# Altium schematic symbol library FPGA_Xilinx_Virtex6.SchLib: 28 symbols (part 10 of 21) (continued)
## XC6VLX195T-FF784 (continued)
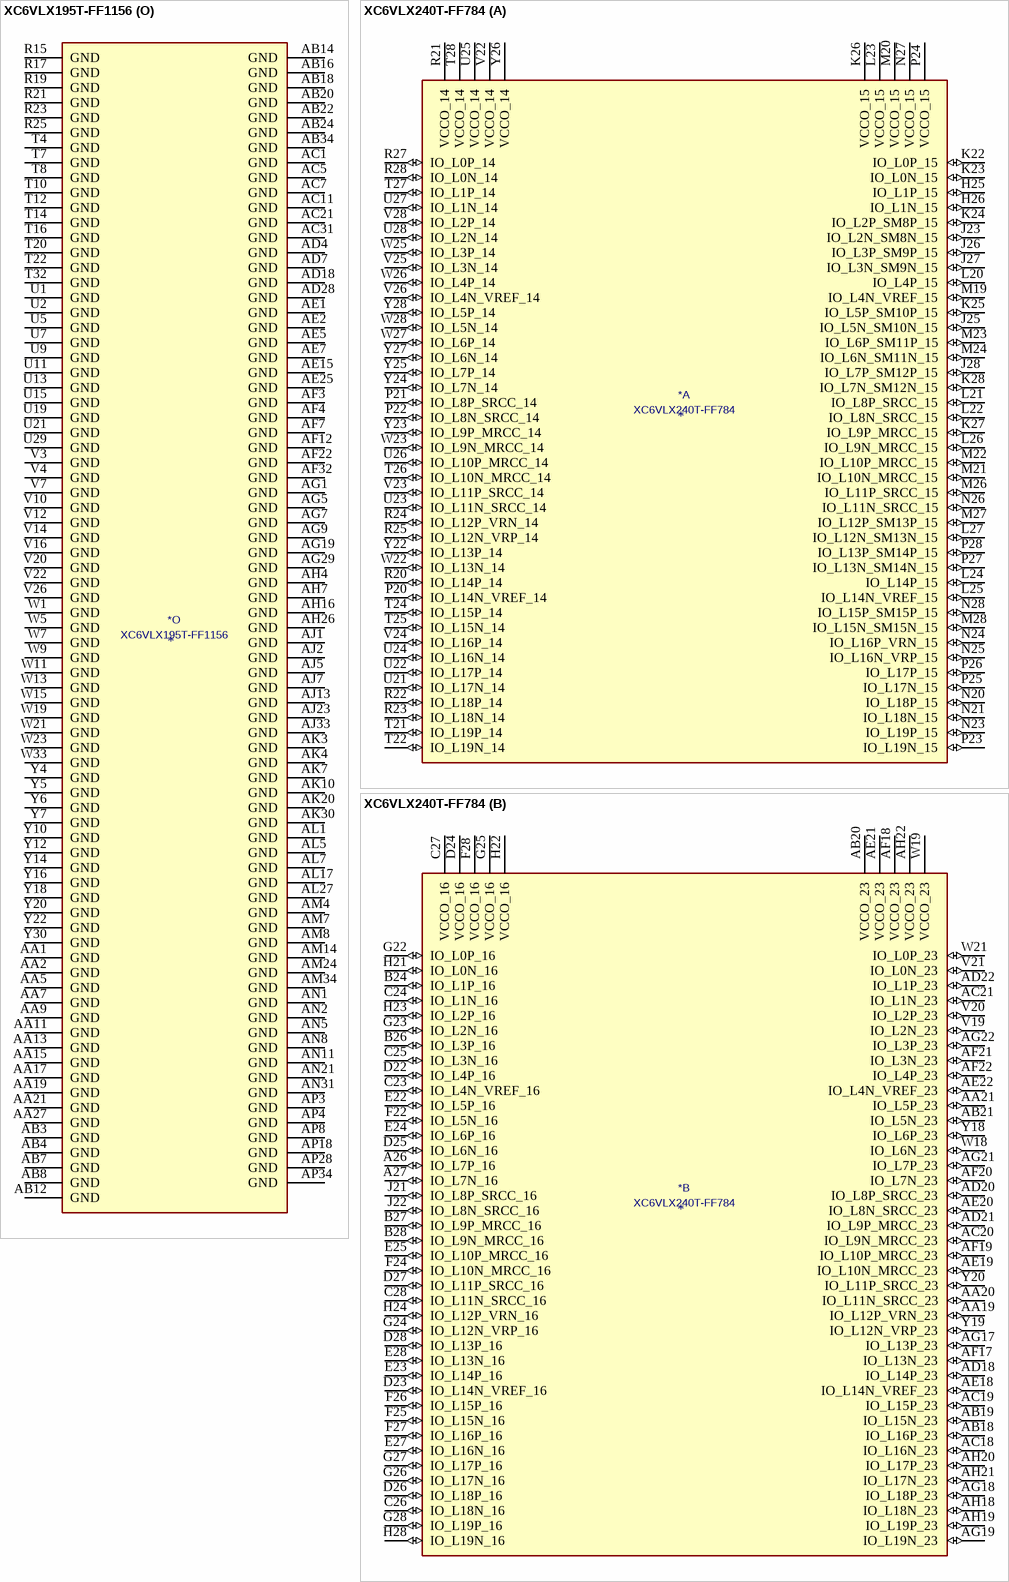
[diagram p52: symbols XC6VLX195T-FF1156 to XC6VLX240T-FF784]

## XC6VLX195T-FF1156
designator *  value XC6VLX195T-FF1156
ki_keywords: FPGA; ki_description: Virtex 6 LXT 195 XC6VLX195T-FF1156
part A pins: AA25 IO_L6P_13 (io), AA26 IO_L17P_13 (io), AA28 IO_L7P_13 (io), AA29 IO_L7N_13 (io), AA30 IO_L1P_13 (io), AA31 IO_L1N_13 (io), AA32 VCCO_13 (power), AA33 IO_L0N_13 (io), AA34 IO_L0P_13 (io), AB25 IO_L19P_13 (io), AB26 IO_L17N_13 (io), AB27 IO_L15P_13 (io), AB28 IO_L13P_13 (io), AB29 VCCO_13 (power), AB30 IO_L3P_13 (io), AB31 IO_L3N_13 (io), AB32 IO_L12P_VRN_13 (io), AB33 IO_L4N_VREF_13 (io), AC25 IO_L19N_13 (io), AC26 VCCO_13 (power), AC27 IO_L15N_13 (io), AC28 IO_L13N_13 (io), AC29 IO_L11N_SRCC_13 (io), AC30 IO_L9N_MRCC_13 (io), AC32 IO_L12N_VRP_13 (io), AC33 IO_L4P_13 (io), AC34 IO_L2N_13 (io), AD25 IO_L0P_12 (io), AD26 IO_L0N_12 (io), AD27 IO_L1N_12 (io), AD29 IO_L11P_SRCC_13 (io), AD30 IO_L9P_MRCC_13 (io), AD31 IO_L5N_13 (io), AD32 IO_L14P_13 (io), AD33 VCCO_13 (power), AD34 IO_L2P_13 (io), AE26 IO_L11N_SRCC_12 (io), AE27 IO_L1P_12 (io), AE28 IO_L3P_12 (io), AE29 IO_L3N_12 (io), AE30 VCCO_13 (power), AE31 IO_L5P_13 (io), AE32 IO_L14N_VREF_13 (io), AE33 IO_L10P_MRCC_13 (io), AE34 IO_L8P_SRCC_13 (io), AF26 IO_L11P_SRCC_12 (io), AF27 VCCO_12 (power), AF28 IO_L5P_12 (io), AF29 IO_L5N_12 (io), AF30 IO_L10P_MRCC_12 (io), AF31 IO_L18N_13 (io), AF33 IO_L10N_MRCC_13 (io), AF34 IO_L8N_SRCC_13 (io), AG27 IO_L9P_MRCC_12 (io), AG28 IO_L9N_MRCC_12 (io), AG30 IO_L10N_MRCC_12 (io), AG31 IO_L18P_13 (io), AG32 IO_L16N_13 (io), AG33 IO_L16P_13 (io), AG34 VCCO_12 (power), AH29 IO_L7P_12 (io), AH30 IO_L7N_12 (io), AH31 VCCO_12 (power), AH32 IO_L2N_12 (io), AH33 IO_L2P_12 (io), AH34 IO_L4N_VREF_12 (io), AJ29 IO_L13P_12 (io), AJ30 IO_L13N_12 (io), AJ31 IO_L12P_VRN_12 (io), AJ32 IO_L12N_VRP_12 (io), AJ34 IO_L4P_12 (io), AK31 IO_L15N_12 (io), AK32 IO_L14N_VREF_12 (io), AK33 IO_L14P_12 (io), AK34 IO_L6N_12 (io), AL30 IO_L19P_12 (io), AL31 IO_L15P_12 (io), AL32 VCCO_12 (power), AL33 IO_L16N_12 (io), AL34 IO_L6P_12 (io), AM31 IO_L19N_12 (io), AM32 IO_L17N_12 (io), AM33 IO_L16P_12 (io), AN32 IO_L17P_12 (io), AN33 IO_L8P_SRCC_12 (io), AN34 IO_L8N_SRCC_12 (io), AP32 IO_L18P_12 (io), AP33 IO_L18N_12 (io), Y26 IO_L6N_13 (io)
part B pins: K31 IO_L2N_SM8N_15 (io), K32 IO_L2P_SM8P_15 (io), K34 IO_L16P_VRN_15 (io), L28 IO_L7P_SM12P_15 (io), L29 IO_L11P_SRCC_15 (io), L30 IO_L11N_SRCC_15 (io), L31 IO_L0N_15 (io), L32 VCCO_15 (power), L33 IO_L6P_SM11P_15 (io), L34 IO_L16N_VRP_15 (io), M25 IO_L1N_15 (io), M26 IO_L3P_SM9P_15 (io), M27 IO_L3N_SM9N_15 (io), M28 IO_L7N_SM12N_15 (io), M29 VCCO_15 (power), M30 IO_L17P_15 (io), M31 IO_L0P_15 (io), M32 IO_L6N_SM11N_15 (io), M33 IO_L10N_MRCC_15 (io), N25 IO_L1P_15 (io), N26 VCCO_15 (power), N27 IO_L5P_SM10P_15 (io), N28 IO_L9P_MRCC_15 (io), N29 IO_L9N_MRCC_15 (io), N30 IO_L17N_15 (io), N32 IO_L8P_SRCC_15 (io), N33 IO_L10P_MRCC_15 (io), N34 IO_L18P_15 (io), P25 IO_L12P_SM13P_15 (io), P26 IO_L12N_SM13N_15 (io), P27 IO_L5N_SM10N_15 (io), P29 IO_L19P_15 (io), P30 IO_L4N_VREF_15 (io), P31 IO_L4P_15 (io), P32 IO_L8N_SRCC_15 (io), P33 VCCO_15 (power), P34 IO_L18N_15 (io), R26 IO_L15P_SM15P_15 (io), R27 IO_L13N_SM14N_15 (io), R28 IO_L13P_SM14P_15 (io), R29 IO_L19N_15 (io), R30 VCCO_15 (power), R31 IO_L14P_15 (io), R32 IO_L14N_VREF_15 (io), R33 IO_L2P_14 (io), R34 IO_L2N_14 (io), T25 IO_L0N_14 (io), T26 IO_L15N_SM15N_15 (io), T27 VCCO_14 (power), T28 IO_L1P_14 (io), T29 IO_L1N_14 (io), T30 IO_L3P_14 (io), T31 IO_L3N_14 (io), T33 IO_L4P_14 (io), T34 IO_L4N_VREF_14 (io), U25 IO_L0P_14 (io), U26 IO_L5P_14 (io), U27 IO_L5N_14 (io), U28 IO_L7P_14 (io), U30 IO_L8N_SRCC_14 (io), U31 IO_L8P_SRCC_14 (io), U32 IO_L6N_14 (io), U33 IO_L6P_14 (io), U34 VCCO_14 (power), V25 IO_L18N_14 (io), V27 IO_L11N_SRCC_14 (io), V28 IO_L11P_SRCC_14 (io), V29 IO_L7N_14 (io), V30 IO_L9P_MRCC_14 (io), V31 VCCO_14 (power), V32 IO_L12P_VRN_14 (io), V33 IO_L12N_VRP_14 (io), V34 IO_L10P_MRCC_14 (io), W25 IO_L18P_14 (io), W26 IO_L19N_14 (io), W27 IO_L19P_14 (io), W28 VCCO_14 (power), W29 IO_L15P_14 (io), W30 IO_L9N_MRCC_14 (io), W31 IO_L16P_14 (io), W32 IO_L16N_14 (io), W34 IO_L10N_MRCC_14 (io), Y27 IO_L17N_14 (io), Y28 IO_L17P_14 (io), Y29 IO_L15N_14 (io), Y31 IO_L13N_14 (io), Y32 IO_L13P_14 (io), Y33 IO_L14P_14 (io), Y34 IO_L14N_VREF_14 (io)
part C pins: A32 VCCO_16 (power), A33 IO_L4P_16 (io), AC19 IO_L14P_22 (io), AC20 IO_L6P_22 (io), AD19 IO_L14N_VREF_22 (io), AD20 IO_L6N_22 (io), AD21 IO_L0N_22 (io), AE19 IO_L8N_SRCC_22 (io), AE20 VCCO_22 (power), AE21 IO_L0P_22 (io), AF19 IO_L8P_SRCC_22 (io), AF20 IO_L11P_SRCC_22 (io), AF21 IO_L11N_SRCC_22 (io), AG20 IO_L18P_22 (io), AG21 IO_L18N_22 (io), AG22 IO_L2P_22 (io), AH20 IO_L12N_VRP_22 (io), AH21 VCCO_22 (power), AH22 IO_L2N_22 (io), AJ20 IO_L12P_VRN_22 (io), AJ21 IO_L16N_22 (io), AJ22 IO_L4N_VREF_22 (io), AK19 IO_L10P_MRCC_22 (io), AK21 IO_L16P_22 (io), AK22 IO_L4P_22 (io), AL18 IO_L1N_22 (io), AL19 IO_L10N_MRCC_22 (io), AL20 IO_L7N_22 (io), AL21 IO_L13N_22 (io), AL22 VCCO_22 (power), AL23 IO_L15N_22 (io), AM18 IO_L1P_22 (io), AM19 VCCO_22 (power), AM20 IO_L7P_22 (io), AM21 IO_L13P_22 (io), AM22 IO_L17P_22 (io), AM23 IO_L15P_22 (io), AN18 IO_L3N_22 (io), AN19 IO_L5P_22 (io), AN20 IO_L5N_22 (io), AN22 IO_L17N_22 (io), AN23 IO_L19N_22 (io), AP19 IO_L3P_22 (io), AP20 IO_L9P_MRCC_22 (io), AP21 IO_L9N_MRCC_22 (io), AP22 IO_L19P_22 (io), AP23 VCCO_22 (power), B32 IO_L0N_16 (io), B33 IO_L4N_VREF_16 (io), B34 IO_L6N_16 (io), C32 IO_L0P_16 (io), C33 IO_L6P_16 (io), C34 IO_L8N_SRCC_16 (io), D31 IO_L15P_16 (io), D32 IO_L15N_16 (io), D33 VCCO_16 (power), D34 IO_L8P_SRCC_16 (io), E31 IO_L11N_SRCC_16 (io), E32 IO_L2P_16 (io), E33 IO_L2N_16 (io), E34 IO_L12P_VRN_16 (io), F30 IO_L3P_16 (io), F31 IO_L11P_SRCC_16 (io), F33 IO_L10P_MRCC_16 (io), F34 IO_L12N_VRP_16 (io), G30 IO_L3N_16 (io), G31 IO_L5P_16 (io), G32 IO_L17P_16 (io), G33 IO_L10N_MRCC_16 (io), G34 VCCO_16 (power), H30 IO_L5N_16 (io), H31 VCCO_16 (power), H32 IO_L17N_16 (io), H33 IO_L14N_VREF_16 (io), H34 IO_L14P_16 (io), J26 IO_L1P_16 (io), J27 IO_L1N_16 (io), J28 VCCO_16 (power), J29 IO_L7N_16 (io), J30 IO_L13P_16 (io), J31 IO_L19P_16 (io), J32 IO_L19N_16 (io), J34 IO_L16N_16 (io), K25 VCCO_16 (power), K26 IO_L9P_MRCC_16 (io), K27 IO_L9N_MRCC_16 (io), K28 IO_L7P_16 (io), K29 IO_L13N_16 (io), K33 IO_L16P_16 (io), L25 IO_L18P_16 (io), L26 IO_L18N_16 (io)
part D pins: AA23 IO_L16P_RS0_24 (io), AA24 IO_L14N_VREF_FOE_B_MOSI_24 (io), AB23 IO_L16N_CSO_B_24 (io), AC22 IO_L19P_24 (io), AC23 IO_L18P_24 (io), AC24 IO_L18N_24 (io), AD22 IO_L19N_24 (io), AD23 VCCO_24 (power), AD24 IO_L11P_SRCC_24 (io), AE22 IO_L17N_VRP_24 (io), AE23 IO_L17P_VRN_24 (io), AE24 IO_L11N_SRCC_24 (io), AF23 IO_L15P_FWE_B_24 (io), AF24 IO_L13N_D0_FS0_24 (io), AF25 IO_L13P_D1_FS1_24 (io), AG23 IO_L15N_RS1_24 (io), AG24 VCCO_24 (power), AG25 IO_L2P_23 (io), AG26 IO_L2N_23 (io), AH23 IO_L11P_SRCC_23 (io), AH24 IO_L11N_SRCC_23 (io), AH25 IO_L8P_SRCC_23 (io), AH27 IO_L0P_23 (io), AH28 IO_L0N_23 (io), AJ24 IO_L14P_23 (io), AJ25 IO_L8N_SRCC_23 (io), AJ26 IO_L12N_VRP_23 (io), AJ27 IO_L10N_MRCC_23 (io), AJ28 VCCO_23 (power), AK23 IO_L18P_23 (io), AK24 IO_L14N_VREF_23 (io), AK25 VCCO_23 (power), AK26 IO_L12P_VRN_23 (io), AK27 IO_L10P_MRCC_23 (io), AK28 IO_L6N_23 (io), AK29 IO_L4N_VREF_23 (io), AL24 IO_L18N_23 (io), AL25 IO_L16N_23 (io), AL26 IO_L13P_23 (io), AL28 IO_L6P_23 (io), AL29 IO_L4P_23 (io), AM25 IO_L16P_23 (io), AM26 IO_L13N_23 (io), AM27 IO_L9N_MRCC_23 (io), AM28 IO_L7N_23 (io), AM29 VCCO_23 (power), AM30 IO_L1N_23 (io), AN24 IO_L17N_23 (io), AN25 IO_L17P_23 (io), AN26 VCCO_23 (power), AN27 IO_L9P_MRCC_23 (io), AN28 IO_L7P_23 (io), AN29 IO_L5P_23 (io), AN30 IO_L1P_23 (io), AP24 IO_L19N_23 (io), AP25 IO_L19P_23 (io), AP26 IO_L15N_23 (io), AP27 IO_L15P_23 (io), AP29 IO_L5N_23 (io), AP30 IO_L3P_23 (io), AP31 IO_L3N_23 (io), F23 IO_L3N_D12_24 (io), F24 IO_L3P_D13_24 (io), G23 IO_L5N_D8_24 (io), G24 VCCO_24 (power), H23 IO_L5P_D9_24 (io), H24 IO_L7N_D4_24 (io), H25 IO_L7P_D5_24 (io), J24 IO_L9N_MRCC_24 (io), J25 IO_L9P_MRCC_24 (io), K23 IO_L1N_GC_24 (io), K24 IO_L1P_GC_24 (io), L22 VCCO_24 (power), L23 IO_L0P_GC_24 (io), L24 IO_L2N_D14_24 (io), M22 IO_L0N_GC_24 (io), M23 IO_L2P_D15_24 (io), N23 IO_L4P_D11_24 (io), N24 IO_L4N_VREF_D10_24 (io), P24 IO_L6N_D6_24 (io), R24 IO_L6P_D7_24 (io), T23 IO_L8N_SRCC_24 (io), T24 IO_L8P_SRCC_24 (io), U23 IO_L10P_MRCC_24 (io), U24 VCCO_24 (power), V23 IO_L10N_MRCC_24 (io), V24 IO_L12P_D3_24 (io), W24 IO_L12N_D2_FS2_24 (io), Y24 IO_L14P_FCS_B_24 (io), Y25 VCCO_24 (power)
part E pins: A18 IO_L15P_26 (io), A19 IO_L15N_26 (io), A20 IO_L7P_26 (io), A21 IO_L7N_26 (io), A22 VCCO_26 (power), A23 IO_L1P_26 (io), A24 IO_L1N_26 (io), A25 IO_L3N_25 (io), A26 IO_L5N_25 (io), A28 IO_L13P_25 (io), A29 IO_L13N_25 (io), A30 IO_L15P_25 (io), A31 IO_L19N_GC_25 (io), B18 IO_L17P_26 (io), B19 VCCO_26 (power), B20 IO_L9P_MRCC_26 (io), B21 IO_L5P_26 (io), B22 IO_L5N_26 (io), B23 IO_L3P_26 (io), B25 IO_L3P_25 (io), B26 IO_L5P_25 (io), B27 IO_L7P_25 (io), B28 IO_L9N_MRCC_25 (io), B29 VCCO_25 (power), B30 IO_L15N_25 (io), B31 IO_L19P_GC_25 (io), C18 IO_L17N_26 (io), C19 IO_L9N_MRCC_26 (io), C20 IO_L0P_26 (io), C22 IO_L19P_26 (io), C23 IO_L3N_26 (io), C24 IO_L1P_25 (io), C25 IO_L1N_25 (io), C26 VCCO_25 (power), C27 IO_L7N_25 (io), C28 IO_L9P_MRCC_25 (io), C29 IO_L10P_MRCC_25 (io), C30 IO_L17P_25 (io), D19 IO_L13N_26 (io), D20 IO_L0N_26 (io), D21 IO_L12P_VRN_26 (io), D22 IO_L19N_26 (io), D23 VCCO_26 (power), D24 IO_L8P_SRCC_25 (io), D25 IO_L0P_25 (io), D26 IO_L0N_25 (io), D27 IO_L4P_25 (io), D29 IO_L10N_MRCC_25 (io), D30 IO_L17N_25 (io), E19 IO_L13P_26 (io), E20 VCCO_26 (power), E21 IO_L12N_VRP_26 (io), E22 IO_L6P_26 (io), E23 IO_L6N_26 (io), E24 IO_L8N_SRCC_25 (io), E26 IO_L2P_25 (io), E27 IO_L4N_VREF_25 (io), E28 IO_L14N_VREF_25 (io), E29 IO_L16P_VRN_25 (io), E30 VCCO_25 (power), F19 IO_L8P_SRCC_26 (io), F20 IO_L8N_SRCC_26 (io), F21 IO_L10P_MRCC_26 (io), F25 IO_L11P_SRCC_25 (io), F26 IO_L2N_25 (io), F27 VCCO_25 (power), F28 IO_L14P_25 (io), F29 IO_L16N_VRP_25 (io), G20 IO_L10N_MRCC_26 (io), G21 IO_L2P_26 (io), G22 IO_L2N_26 (io), G25 IO_L11N_SRCC_25 (io), G26 IO_L6P_25 (io), G27 IO_L6N_25 (io), G28 IO_L12N_25 (io), H19 IO_L11P_SRCC_26 (io), H20 IO_L11N_SRCC_26 (io), H21 VCCO_26 (power), H22 IO_L14P_26 (io), H27 IO_L12P_25 (io), H28 IO_L18P_GC_25 (io), H29 IO_L18N_GC_25 (io), J20 IO_L4P_26 (io), J21 IO_L4N_VREF_26 (io), J22 IO_L14N_VREF_26 (io), K21 IO_L16P_26 (io), K22 IO_L16N_26 (io), L20 IO_L18P_26 (io), L21 IO_L18N_26 (io)
part F pins: AC12 IO_L9N_MRCC_33 (io), AC13 IO_L9P_MRCC_33 (io), AC14 IO_L2N_33 (io), AC15 IO_L9P_MRCC_32 (io), AC16 VCCO_32 (power), AC17 IO_L11N_SRCC_32 (io), AC18 IO_L11P_SRCC_32 (io), AD11 IO_L10N_MRCC_33 (io), AD12 IO_L10P_MRCC_33 (io), AD13 VCCO_33 (power), AD14 IO_L2P_33 (io), AD15 IO_L9N_MRCC_32 (io), AD16 IO_L10N_MRCC_32 (io), AD17 IO_L16P_32 (io), AE11 IO_L4N_VREF_33 (io), AE12 IO_L0N_33 (io), AE13 IO_L0P_33 (io), AE14 IO_L14P_33 (io), AE16 IO_L10P_MRCC_32 (io), AE17 IO_L16N_32 (io), AE18 IO_L18P_32 (io), AF11 IO_L4P_33 (io), AF13 IO_L12P_VRN_33 (io), AF14 IO_L14N_VREF_33 (io), AF15 IO_L0N_32 (io), AF16 IO_L4N_VREF_32 (io), AF17 VCCO_32 (power), AF18 IO_L18N_32 (io), AG10 IO_L6N_33 (io), AG11 IO_L6P_33 (io), AG12 IO_L16P_33 (io), AG13 IO_L12N_VRP_33 (io), AG14 VCCO_33 (power), AG15 IO_L0P_32 (io), AG16 IO_L4P_32 (io), AG17 IO_L8N_SRCC_32 (io), AG18 IO_L12N_VRP_32 (io), AH10 IO_L8N_SRCC_33 (io), AH11 VCCO_33 (power), AH12 IO_L16N_33 (io), AH13 IO_L18P_33 (io), AH14 IO_L18N_33 (io), AH15 IO_L2N_32 (io), AH17 IO_L8P_SRCC_32 (io), AH18 IO_L12P_VRN_32 (io), AH19 IO_L14N_VREF_32 (io), AJ10 IO_L8P_SRCC_33 (io), AJ11 IO_L1P_33 (io), AJ12 IO_L3N_33 (io), AJ14 IO_L1N_32 (io), AJ15 IO_L2P_32 (io), AJ16 IO_L6N_32 (io), AJ17 IO_L6P_32 (io), AJ18 VCCO_32 (power), AJ19 IO_L14P_32 (io), AK11 IO_L1N_33 (io), AK12 IO_L3P_33 (io), AK13 IO_L17P_33 (io), AK14 IO_L1P_32 (io), AK15 VCCO_32 (power), AK16 IO_L19N_32 (io), AK17 IO_L17N_32 (io), AK18 IO_L17P_32 (io), AL10 IO_L5N_33 (io), AL11 IO_L7P_33 (io), AL12 VCCO_33 (power), AL13 IO_L17N_33 (io), AL14 IO_L3N_32 (io), AL15 IO_L3P_32 (io), AL16 IO_L19P_32 (io), AM10 IO_L5P_33 (io), AM11 IO_L7N_33 (io), AM12 IO_L13P_33 (io), AM13 IO_L15N_33 (io), AM15 IO_L5N_32 (io), AM16 IO_L15N_32 (io), AM17 IO_L15P_32 (io), AN12 IO_L13N_33 (io), AN13 IO_L15P_33 (io), AN14 IO_L19N_33 (io), AN15 IO_L5P_32 (io), AN16 VCCO_32 (power), AN17 IO_L13P_32 (io), AP11 IO_L11P_SRCC_33 (io), AP12 IO_L11N_SRCC_33 (io), AP13 VCCO_33 (power), AP14 IO_L19P_33 (io), AP15 IO_L7N_32 (io), AP16 IO_L7P_32 (io), AP17 IO_L13N_32 (io)
part G pins: A8 IO_L5N_A08_D24_34 (io), A9 IO_L5P_A09_D25_34 (io), A10 IO_L1P_GC_34 (io), A11 IO_L13P_SM6P_35 (io), A12 VCCO_35 (power), A13 IO_L3P_SM1P_35 (io), A14 IO_L3N_SM1N_35 (io), AB10 IO_L10N_MRCC_34 (io), AC9 IO_L12N_A02_D18_34 (io), AC10 IO_L10P_MRCC_34 (io), AD9 IO_L14P_A25_34 (io), AD10 IO_L12P_A03_D19_34 (io), AE9 IO_L14N_VREF_A24_34 (io), AE10 VCCO_34 (power), AF9 IO_L16P_A21_34 (io), AF10 IO_L16N_A20_34 (io), AG8 IO_L18P_A17_34 (io), AH8 IO_L18N_A16_34 (io), AH9 IO_L11P_SRCC_34 (io), AJ8 VCCO_34 (power), AJ9 IO_L11N_SRCC_34 (io), AK8 IO_L13P_A01_D17_34 (io), AK9 IO_L15P_A23_34 (io), AL8 IO_L13N_A00_D16_34 (io), AL9 IO_L15N_A22_34 (io), AM9 VCCO_34 (power), AN9 IO_L17P_A19_34 (io), AN10 IO_L19P_VRN_34 (io), AP9 IO_L17N_A18_34 (io), AP10 IO_L19N_VRP_34 (io), B8 IO_L7P_A05_D21_34 (io), B9 VCCO_34 (power), B10 IO_L1N_GC_34 (io), B11 IO_L13N_SM6N_35 (io), B12 IO_L7P_SM4P_35 (io), B13 IO_L7N_SM4N_35 (io), C8 IO_L7N_A04_D20_34 (io), C9 IO_L4P_A11_D27_34 (io), C10 IO_L3P_A13_D29_34 (io), C12 IO_L11N_SRCC_35 (io), C13 IO_L11P_SRCC_35 (io), C14 IO_L1N_35 (io), D9 IO_L4N_VREF_A10_D26_34 (io), D10 IO_L3N_A12_D28_34 (io), D11 IO_L19P_GC_35 (io), D12 IO_L17P_35 (io), D13 VCCO_35 (power), D14 IO_L1P_35 (io), E8 IO_L6P_A07_D23_34 (io), E9 IO_L6N_A06_D22_34 (io), E10 VCCO_34 (power), E11 IO_L19N_GC_35 (io), E12 IO_L17N_35 (io), E13 IO_L15P_SM7P_35 (io), E14 IO_L5N_SM2N_35 (io), F9 IO_L2P_A15_D31_34 (io), F10 IO_L2N_A14_D30_34 (io), F11 IO_L2N_SM0N_35 (io), F13 IO_L15N_SM7N_35 (io), F14 IO_L5P_SM2P_35 (io), G10 IO_L6N_SM3N_35 (io), G11 IO_L2P_SM0P_35 (io), G12 IO_L4P_35 (io), G13 IO_L0P_35 (io), G14 VCCO_35 (power), H9 IO_L0N_GC_34 (io), H10 IO_L6P_SM3P_35 (io), H11 VCCO_35 (power), H12 IO_L12P_SM5P_35 (io), H13 IO_L4N_VREF_35 (io), H14 IO_L0N_35 (io), J9 IO_L0P_GC_34 (io), J10 IO_L14N_VREF_35 (io), J11 IO_L14P_35 (io), J12 IO_L12N_SM5N_35 (io), J14 IO_L8N_SRCC_35 (io), K9 IO_L8N_SRCC_34 (io), K11 IO_L16P_VRN_35 (io), K12 IO_L18N_GC_35 (io), K13 IO_L18P_GC_35 (io), K14 IO_L8P_SRCC_35 (io), L9 IO_L8P_SRCC_34 (io), L10 IO_L9P_MRCC_34 (io), L11 IO_L16N_VRP_35 (io), L12 VCCO_35 (power), L13 IO_L9P_MRCC_35 (io), M9 VCCO_34 (power), M10 IO_L9N_MRCC_34 (io), M11 IO_L10N_MRCC_35 (io), M12 IO_L10P_MRCC_35 (io), M13 IO_L9N_MRCC_35 (io)
part H pins: A15 IO_L15P_36 (io), A16 IO_L11P_SRCC_36 (io), B15 IO_L15N_36 (io), B16 IO_L11N_SRCC_36 (io), B17 IO_L5N_36 (io), C15 IO_L19N_36 (io), C16 VCCO_36 (power), C17 IO_L5P_36 (io), D15 IO_L19P_36 (io), D16 IO_L13N_36 (io), D17 IO_L1N_36 (io), E16 IO_L13P_36 (io), E17 IO_L0N_36 (io), E18 IO_L1P_36 (io), F15 IO_L16N_36 (io), F16 IO_L12P_VRN_36 (io), F17 VCCO_36 (power), F18 IO_L0P_36 (io), G15 IO_L16P_36 (io), G16 IO_L12N_VRP_36 (io), G17 IO_L3N_36 (io), G18 IO_L8P_SRCC_36 (io), H15 IO_L18P_36 (io), H17 IO_L3P_36 (io), H18 IO_L8N_SRCC_36 (io), J15 IO_L18N_36 (io), J16 IO_L14N_VREF_36 (io), J17 IO_L14P_36 (io), J18 VCCO_36 (power), J19 IO_L6N_36 (io), K15 VCCO_36 (power), K16 IO_L9P_MRCC_36 (io), K17 IO_L2N_36 (io), K18 IO_L2P_36 (io), K19 IO_L6P_36 (io), L14 IO_L10N_MRCC_36 (io), L15 IO_L10P_MRCC_36 (io), L16 IO_L9N_MRCC_36 (io), L18 IO_L4N_VREF_36 (io), L19 IO_L4P_36 (io), M15 IO_L17N_36 (io), M16 IO_L17P_36 (io), M17 IO_L7N_36 (io), M18 IO_L7P_36 (io)
part I pins: AB1 MGTTXP3_113 (io), AB2 MGTTXN3_113 (io), AB5 MGTREFCLK1N_113 (io), AB6 MGTREFCLK1P_113 (io), AC3 MGTRXP3_113 (io), AC4 MGTRXN3_113 (io), AD1 MGTTXP2_113 (io), AD2 MGTTXN2_113 (io), AD5 MGTREFCLK0N_113 (io), AD6 MGTREFCLK0P_113 (io), AE3 MGTRXP2_113 (io), AE4 MGTRXN2_113 (io), AF1 MGTTXP1_113 (io), AF2 MGTTXN1_113 (io), AF5 MGTRXP1_113 (io), AF6 MGTRXN1_113 (io), AG3 MGTRXP0_113 (io), AG4 MGTRXN0_113 (io), AH1 MGTTXP0_113 (io), AH2 MGTTXN0_113 (io), AH5 MGTREFCLK1N_112 (io), AH6 MGTREFCLK1P_112 (io), AJ3 MGTRXP3_112 (io), AJ4 MGTRXN3_112 (io), AK1 MGTTXP3_112 (io), AK2 MGTTXN3_112 (io), AK5 MGTREFCLK0N_112 (io), AK6 MGTREFCLK0P_112 (io), AL3 MGTRXP2_112 (io), AL4 MGTRXN2_112 (io), AM1 MGTTXP2_112 (io), AM2 MGTTXN2_112 (io), AM5 MGTRXP1_112 (io), AM6 MGTRXN1_112 (io), AN3 MGTTXP1_112 (io), AN4 MGTTXN1_112 (io), AP1 MGTTXP0_112 (io), AP2 MGTTXN0_112 (io), AP5 MGTRXP0_112 (io), AP6 MGTRXN0_112 (io)
part J pins: AA3 MGTRXP0_114 (io), AA4 MGTRXN0_114 (io), F1 MGTTXP3_115 (io), F2 MGTTXN3_115 (io), H1 MGTTXP2_115 (io), H2 MGTTXN2_115 (io), J3 MGTRXP3_115 (io), J4 MGTRXN3_115 (io), K1 MGTTXP1_115 (io), K2 MGTTXN1_115 (io), K5 MGTRXP2_115 (io), K6 MGTRXN2_115 (io), L3 MGTRXP1_115 (io), L4 MGTRXN1_115 (io), M1 MGTTXP0_115 (io), M2 MGTTXN0_115 (io), M5 MGTREFCLK1N_115 (io), M6 MGTREFCLK1P_115 (io), N3 MGTRXP0_115 (io), N4 MGTRXN0_115 (io), P1 MGTTXP3_114 (io), P2 MGTTXN3_114 (io), P5 MGTREFCLK0N_115 (io), P6 MGTREFCLK0P_115 (io), R3 MGTRXP3_114 (io), R4 MGTRXN3_114 (io), T1 MGTTXP2_114 (io), T2 MGTTXN2_114 (io), T5 MGTREFCLK1N_114 (io), T6 MGTREFCLK1P_114 (io), U3 MGTRXP2_114 (io), U4 MGTRXN2_114 (io), V1 MGTTXP1_114 (io), V2 MGTTXN1_114 (io), V5 MGTREFCLK0N_114 (io), V6 MGTREFCLK0P_114 (io), W3 MGTRXP1_114 (io), W4 MGTRXN1_114 (io), Y1 MGTTXP0_114 (io), Y2 MGTTXN0_114 (io)
part K pins: A3 MGTTXP3_116 (io), A4 MGTTXN3_116 (io), B1 MGTTXP2_116 (io), B2 MGTTXN2_116 (io), B5 MGTRXP3_116 (io), B6 MGTRXN3_116 (io), C3 MGTTXP1_116 (io), C4 MGTTXN1_116 (io), D1 MGTTXP0_116 (io), D2 MGTTXN0_116 (io), D5 MGTRXP2_116 (io), D6 MGTRXN2_116 (io), E3 MGTRXP1_116 (io), E4 MGTRXN1_116 (io), F5 MGTREFCLK1N_116 (io), F6 MGTREFCLK1P_116 (io), G3 MGTRXP0_116 (io), G4 MGTRXN0_116 (io), H5 MGTREFCLK0N_116 (io), H6 MGTREFCLK0P_116 (io)
part L pins: AA6 MGTAVCC_S (power), AC2 MGTAVTT_S (power), AC6 MGTAVCC_S (power), AD3 MGTAVTT_S (power), AE6 MGTAVCC_S (power), AG2 MGTAVTT_S (power), AG6 MGTAVCC_S (power), AH3 MGTAVTT_S (power), AJ6 MGTAVCC_S (power), AL2 MGTAVTT_S (power), AL6 MGTAVCC_S (power), AM3 MGTAVTT_S (power), AN6 MGTAVCC_S (power), AN7 MGTRREF_115 (power), AP7 MGTAVTTRCAL_115 (power), C2 MGTAVTT_N (power), C6 MGTAVCC_N (power), D3 MGTAVTT_N (power), E6 MGTAVCC_N (power), G2 MGTAVTT_N (power), G6 MGTAVCC_N (power), H3 MGTAVTT_N (power), J6 MGTAVCC_N (power), L2 MGTAVTT_N (power), L6 MGTAVCC_N (power), M3 MGTAVTT_N (power), N6 MGTAVCC_N (power), R2 MGTAVTT_S (power), R6 MGTAVCC_S (power), T3 MGTAVTT_S (power), U6 MGTAVCC_S (power), W2 MGTAVTT_S (power), W6 MGTAVCC_S (power), Y3 MGTAVTT_S (power)
part M pins: AA8 DOUT_BUSY_0 (io), AB9 VCCO_0 (power), AC8 TDO_0 (io), AD8 TDI_0 (io), AE8 TCK_0 (io), AF8 TMS_0 (io), F8 CSI_B_0 (io), G8 RDWR_B_0 (io), H8 DIN_0 (io), K8 CCLK_0 (io), L8 PROGRAM_B_0 (io), M8 HSWAPEN_0 (io), P8 INIT_B_0 (io), R8 DONE_0 (io), U8 M0_0 (io), U17 VREFN_0 (io), U18 VP_0 (io), V8 M2_0 (io), V17 VN_0 (io), V18 VREFP_0 (io), W8 M1_0 (io), W17 DXN_0 (io), W18 DXP_0 (io), Y9 VCCO_0 (power)
part N pins: A1 GND (power), A2 GND (power), A5 GND (power), A6 GND (power), A7 GND (power), A17 GND (power), A27 GND (power), A34 GND (power), AA10 VCCAUX (power), AA12 VCCINT (power), AA14 VCCINT (power), AA16 VCCINT (power), AA18 VCCINT (power), AA20 VCCINT (power), AA22 VCCAUX (power), AB11 VCCINT (power), AB13 VCCINT (power), AB15 VCCINT (power), AB17 VCCINT (power), AB19 VCCINT (power), AB21 VCCINT (power), B3 GND (power), B4 GND (power), B7 GND (power), B14 GND (power), B24 GND (power), C1 GND (power), C5 GND (power), C7 GND (power), C11 GND (power), C21 GND (power), C31 GND (power), D4 GND (power), D7 GND (power), D8 GND (power), D18 GND (power), D28 GND (power), E1 GND (power), E2 GND (power), E5 GND (power), E7 GND (power), E15 GND (power), E25 GND (power), F3 GND (power), F4 GND (power), F7 GND (power), F12 GND (power), F22 GND (power), F32 GND (power), G1 GND (power), G5 GND (power), G7 GND (power), G9 GND (power), G19 GND (power), G29 GND (power), H4 GND (power), H7 GND (power), H16 GND (power), H26 GND (power), J1 GND (power), J2 GND (power), J5 GND (power), J7 GND (power), J8 GND (power), J13 GND (power), J23 GND (power), J33 GND (power), K3 GND (power), K4 GND (power), K7 GND (power), K10 GND (power), K20 GND (power), K30 GND (power), L1 GND (power), L5 GND (power), L7 GND (power), L17 GND (power), L27 GND (power), M4 GND (power), M7 GND (power), M14 GND (power), M19 VCCINT (power), M20 GND (power), M21 VCCINT (power), M24 GND (power), M34 GND (power), N1 GND (power), N2 GND (power), N5 GND (power), N7 GND (power), N8 VBATT_0 (power), N9 GND (power), N10 VCCAUX (power), N11 GND (power), N12 VCCINT (power), N13 GND (power), N14 VCCINT (power), N15 GND (power), N16 VCCINT (power), N17 GND (power), N18 VCCINT (power), N19 GND (power), N20 VCCINT (power), N21 GND (power), N22 VCCAUX (power), N31 GND (power), P3 GND (power), P4 GND (power), P7 GND (power), P9 VCCAUX (power), P10 GND (power), P11 VCCINT (power), P12 GND (power), P13 VCCINT (power), P14 GND (power), P15 VCCINT (power), P16 GND (power), P17 VCCINT (power), P18 GND (power), P19 VCCINT (power), P20 GND (power), P21 VCCINT (power), P22 GND (power), P23 VCCAUX (power), P28 GND (power), R1 GND (power), R5 GND (power), R7 GND (power), R9 GND (power), R10 VCCINT (power), R11 GND (power), R12 VCCINT (power), R13 GND (power), R14 VCCINT (power), R16 VCCINT (power), R18 VCCINT (power), R20 VCCINT (power), R22 VCCAUX (power), T9 VCCAUX (power), T11 VCCINT (power), T13 VCCINT (power), T15 VCCINT (power), T17 AVSS_0 (power), T18 AVDD_0 (power), T19 VCCINT (power), T21 VCCINT (power), U10 VCCINT (power), U12 VCCINT (power), U14 VCCINT (power), U16 VCCINT (power), U20 VCCINT (power), U22 VCCAUX (power), V9 VCCAUX (power), V11 VCCINT (power), V13 VCCINT (power), V15 VCCINT (power), V19 VCCINT (power), V21 VCCINT (power), W10 VCCAUX (power), W12 VCCINT (power), W14 VCCINT (power), W16 VCCINT (power), W20 VCCINT (power), W22 VCCAUX (power), Y8 VFS_0 (power), Y11 VCCINT (power), Y13 VCCINT (power), Y15 VCCINT (power), Y17 VCCINT (power), Y19 VCCINT (power), Y21 VCCINT (power), Y23 VCCAUX (power)
part O pins: AA1 GND (power), AA2 GND (power), AA5 GND (power), AA7 GND (power), AA9 GND (power), AA11 GND (power), AA13 GND (power), AA15 GND (power), AA17 GND (power), AA19 GND (power), AA21 GND (power), AA27 GND (power), AB3 GND (power), AB4 GND (power), AB7 GND (power), AB8 GND (power), AB12 GND (power), AB14 GND (power), AB16 GND (power), AB18 GND (power), AB20 GND (power), AB22 GND (power), AB24 GND (power), AB34 GND (power), AC1 GND (power), AC5 GND (power), AC7 GND (power), AC11 GND (power), AC21 GND (power), AC31 GND (power), AD4 GND (power), AD7 GND (power), AD18 GND (power), AD28 GND (power), AE1 GND (power), AE2 GND (power), AE5 GND (power), AE7 GND (power), AE15 GND (power), AE25 GND (power), AF3 GND (power), AF4 GND (power), AF7 GND (power), AF12 GND (power), AF22 GND (power), AF32 GND (power), AG1 GND (power), AG5 GND (power), AG7 GND (power), AG9 GND (power), AG19 GND (power), AG29 GND (power), AH4 GND (power), AH7 GND (power), AH16 GND (power), AH26 GND (power), AJ1 GND (power), AJ2 GND (power), AJ5 GND (power), AJ7 GND (power), AJ13 GND (power), AJ23 GND (power), AJ33 GND (power), AK3 GND (power), AK4 GND (power), AK7 GND (power), AK10 GND (power), AK20 GND (power), AK30 GND (power), AL1 GND (power), AL5 GND (power), AL7 GND (power), AL17 GND (power), AL27 GND (power), AM4 GND (power), AM7 GND (power), AM8 GND (power), AM14 GND (power), AM24 GND (power), AM34 GND (power), AN1 GND (power), AN2 GND (power), AN5 GND (power), AN8 GND (power), AN11 GND (power), AN21 GND (power), AN31 GND (power), AP3 GND (power), AP4 GND (power), AP8 GND (power), AP18 GND (power), AP28 GND (power), AP34 GND (power), R15 GND (power), R17 GND (power), R19 GND (power), R21 GND (power), R23 GND (power), R25 GND (power), T4 GND (power), T7 GND (power), T8 GND (power), T10 GND (power), T12 GND (power), T14 GND (power), T16 GND (power), T20 GND (power), T22 GND (power), T32 GND (power), U1 GND (power), U2 GND (power), U5 GND (power), U7 GND (power), U9 GND (power), U11 GND (power), U13 GND (power), U15 GND (power), U19 GND (power), U21 GND (power), U29 GND (power), V3 GND (power), V4 GND (power), V7 GND (power), V10 GND (power), V12 GND (power), V14 GND (power), V16 GND (power), V20 GND (power), V22 GND (power), V26 GND (power), W1 GND (power), W5 GND (power), W7 GND (power), W9 GND (power), W11 GND (power), W13 GND (power), W15 GND (power), W19 GND (power), W21 GND (power), W23 GND (power), W33 GND (power), Y4 GND (power), Y5 GND (power), Y6 GND (power), Y7 GND (power), Y10 GND (power), Y12 GND (power), Y14 GND (power), Y16 GND (power), Y18 GND (power), Y20 GND (power), Y22 GND (power), Y30 GND (power)

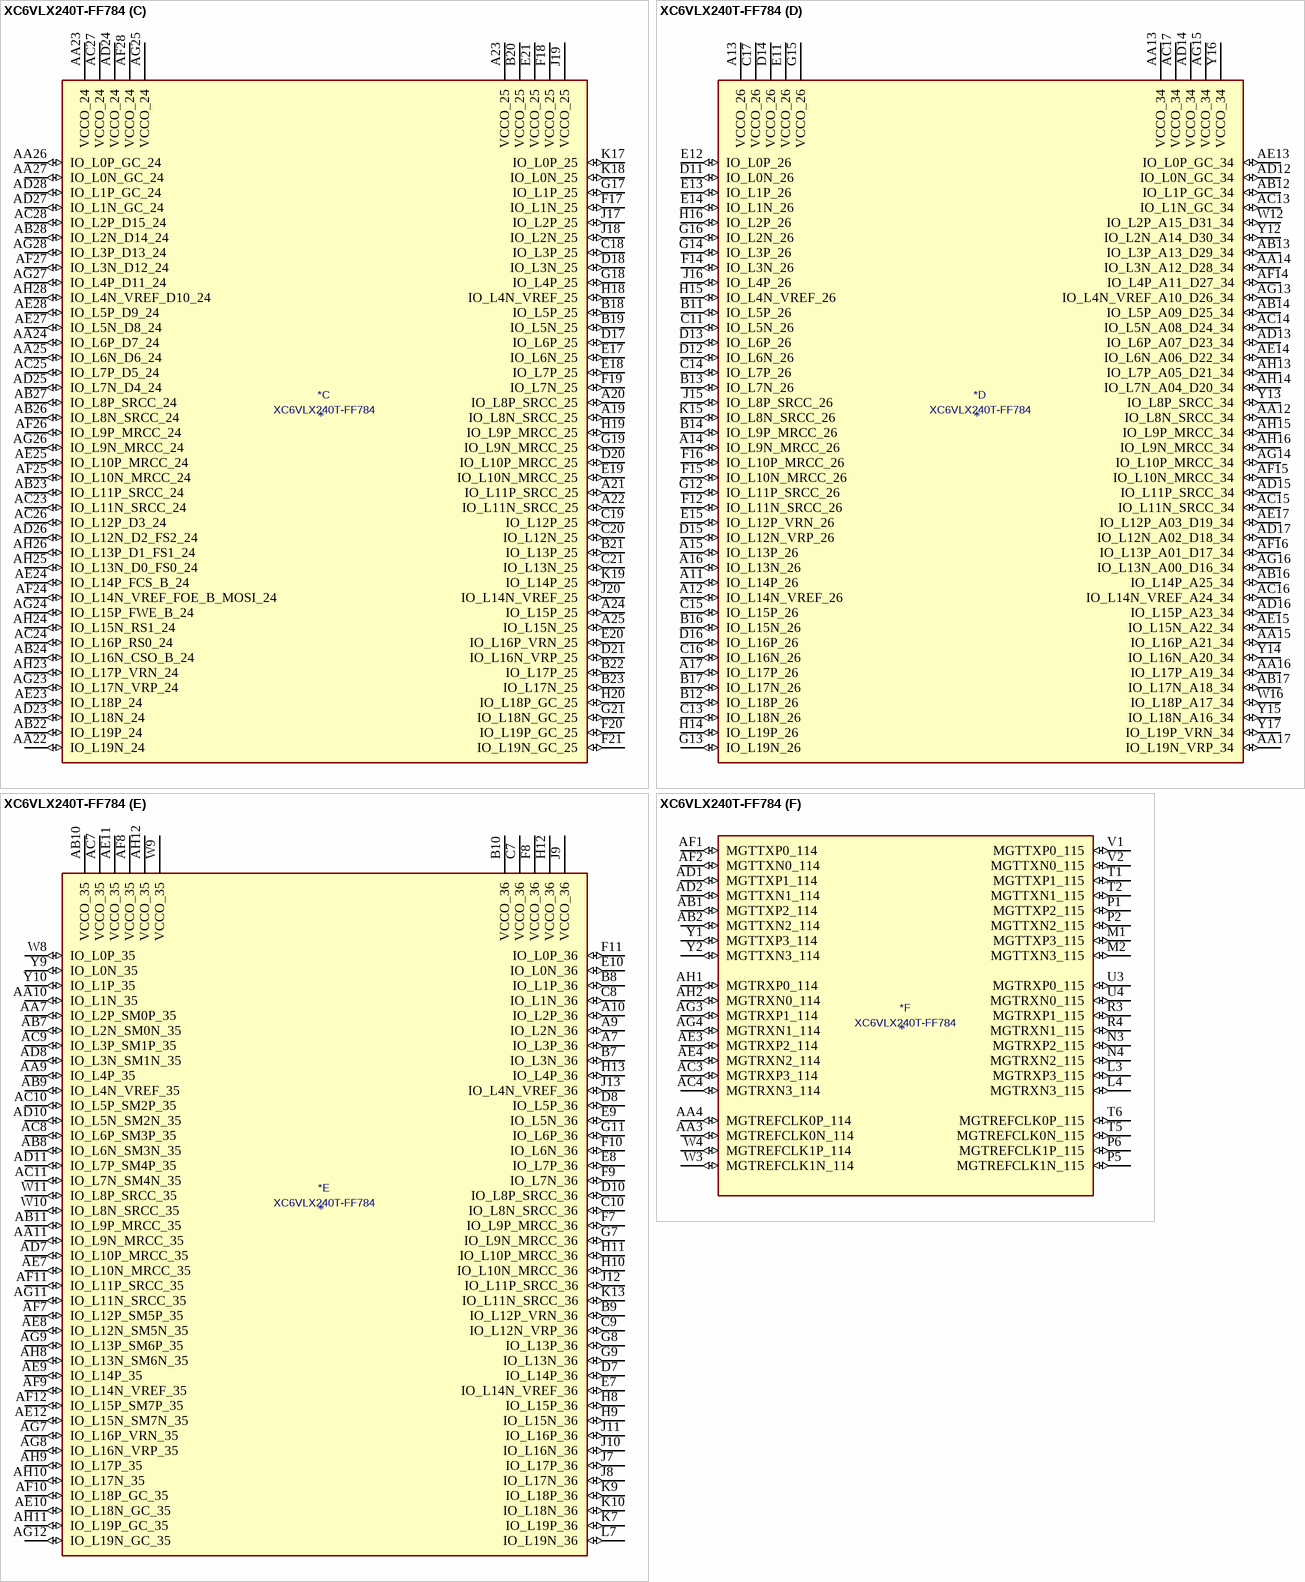
[diagram p53: symbol XC6VLX240T-FF784]

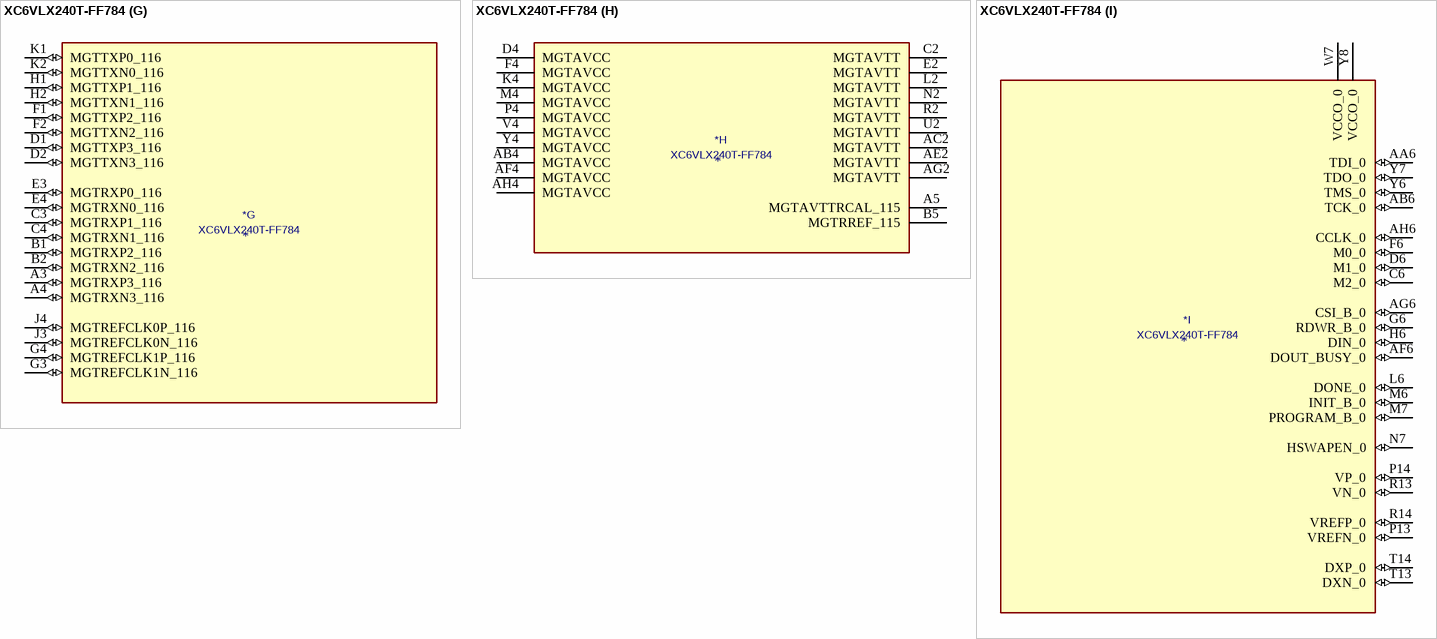
[diagram p54: symbol XC6VLX240T-FF784]

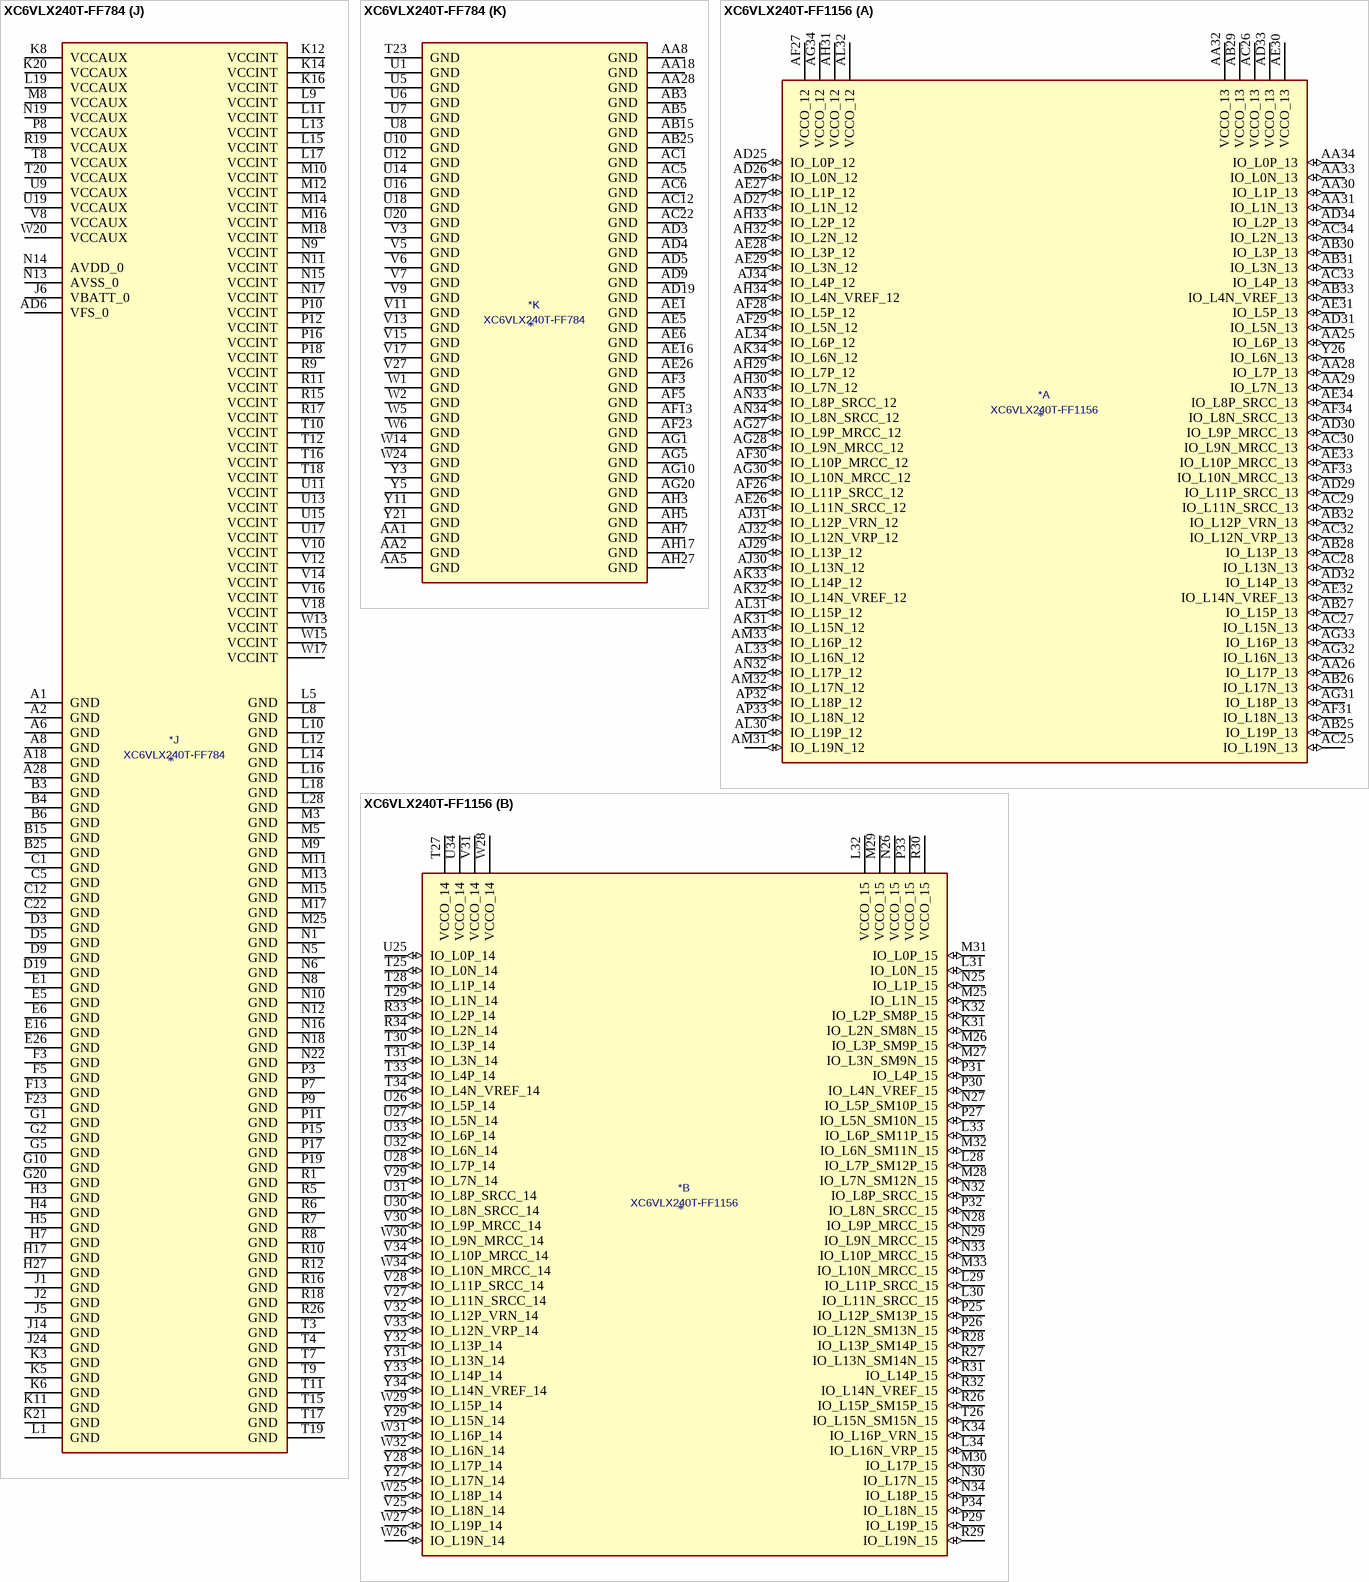
[diagram p55: symbols XC6VLX240T-FF784 to XC6VLX240T-FF1156]